# Altium footprint library Connectors.PcbLib: 164 footprints (part 8 of 11)
Each footprint in its own frame and in the unit in brackets; x right, y up, seen from the top. Pads: shape width x height; smd on the part's side, far side on the other; paste and mask are expansions set on the pad; w line width, h text height; cw(c..) or ccw(c..) is an arc to the next point about the centre after c.
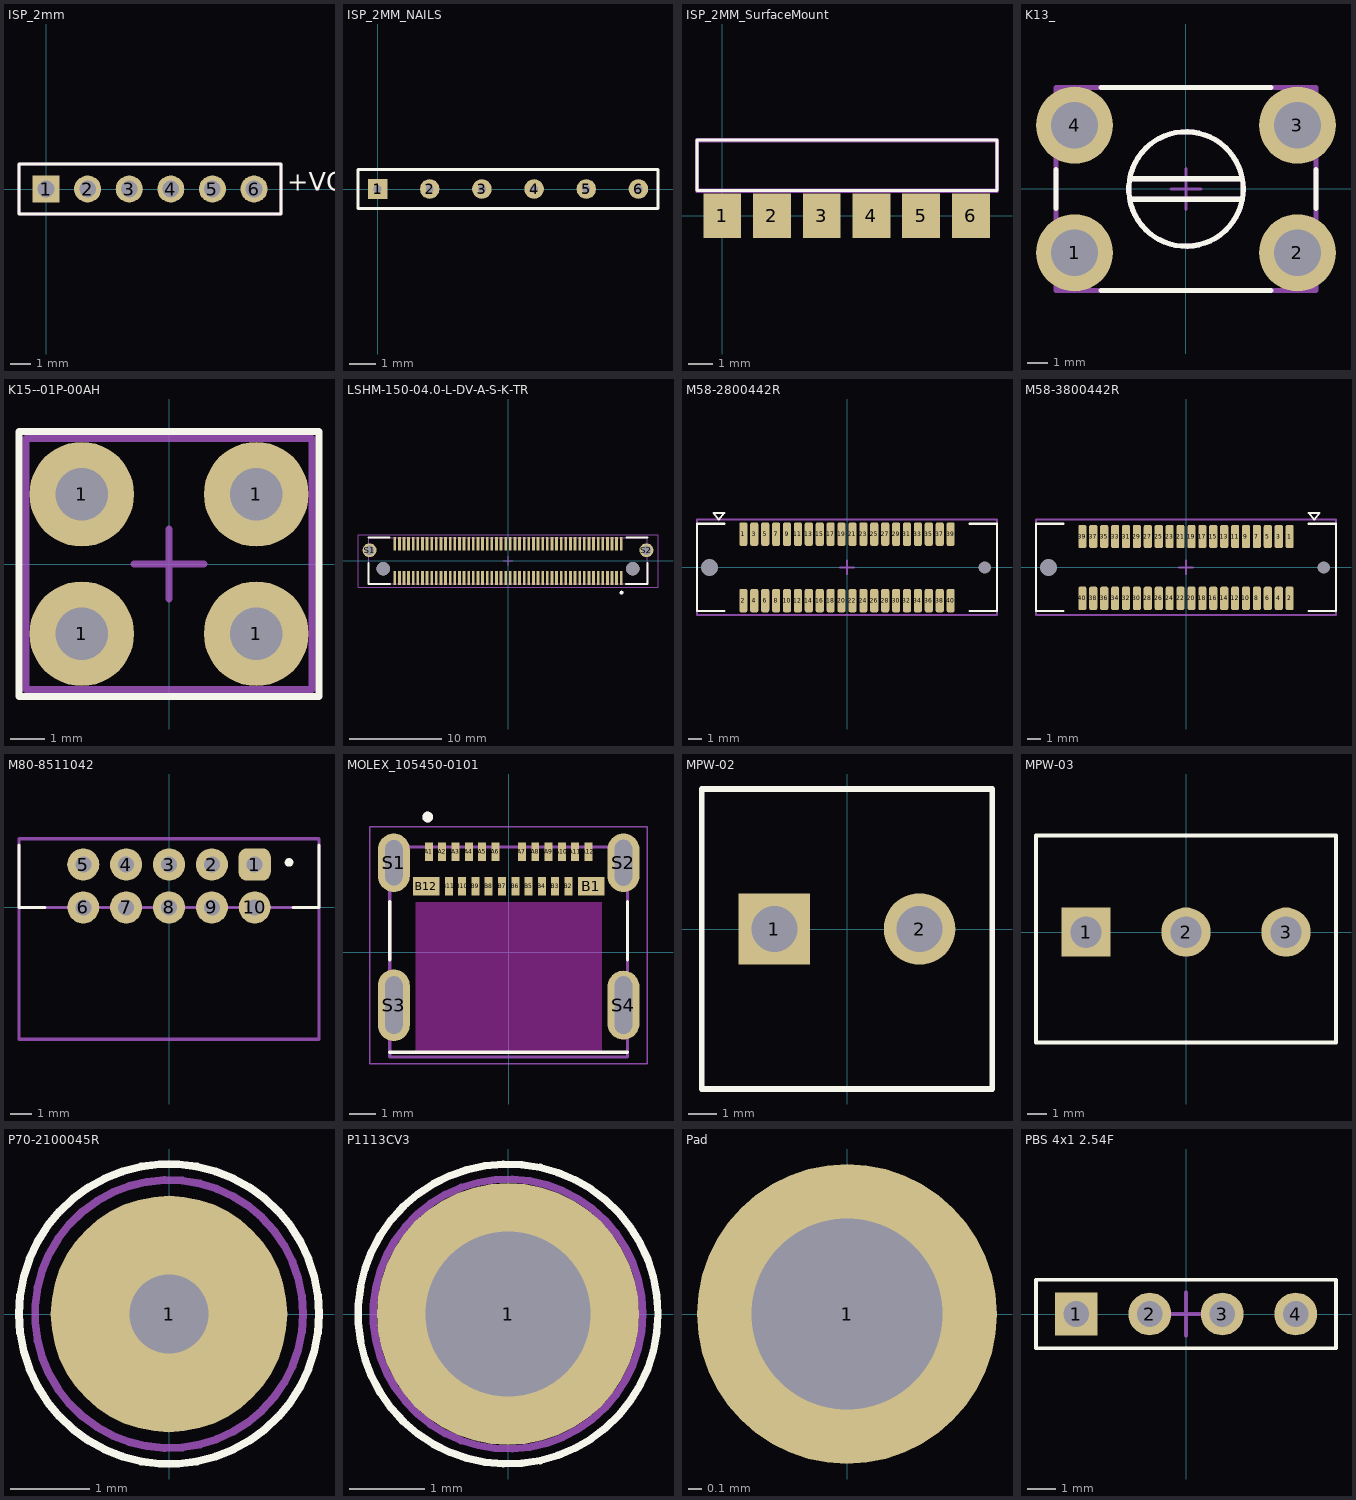
[diagram p7: the footprints below, top view; thin cyan lines are the x and y axes]

## ISP_2mm [mm]
height 4.5
pads (6):
  rect 1.3x1.3 hole 0.8: 1(0,0)
  round 1.3 hole 0.8: 2(2,0) 3(4,0) 4(6,0) 5(8,0) 6(10,0)
Top Overlay:
  lines w0.127: -1.3,-1.2 11.3,-1.2 11.3,1.2 -1.3,1.2 -1.3,-0.284 -1.3,-1.2
  text "+VCC" at 11.6,-0.4 h1.52
Mechanical 15:
  lines w0.15: -1.3,-1.2 -1.3,1.2 11.3,1.2 11.3,-1.2 -1.3,-1.2
3D body "DS1026-01-1x6.STEP": height 4.3, standoff -2.4, extent -1.3,-1.2 11.3,1.2

## ISP_2MM_NAILS [mm]
pads (6):
  rect 0.75x0.75 hole 0.3: 1(0,0)
  round 0.75 hole 0.3: 2(2,0) 3(4,0) 4(6,0) 5(8,0) 6(10,0)
Top Overlay:
  lines w0.127: -0.75,-0.75 10.75,-0.75 10.75,0.75 -0.75,0.75 -0.75,-0.266 -0.75,-0.75

## ISP_2MM_SurfaceMount [mil]
height 177.17
pads (6):
  rect 60x70 smd: 1(0,0) 2(78.74,0) 3(157.48,0) 4(236.22,0) 5(314.96,0) 6(393.7,0)
Top Overlay:
  lines w5: -40,40 435,40 435,120 -40,120 -40,40
Mechanical 13:
  lines w7: -40,40 435,40 435,120 -40,120 -40,40
3D body: height 177.17, standoff 0, extent -39.98,40.02 434.98,119.98

## K13_ [mm]
height 10
pads (4):
  round 3.8 hole 2.3: 1(-5.5,-3.15) 2(5.5,-3.15) 3(5.5,3.15) 4(-5.5,3.15)
Top Overlay:
  circle w0.254: c0,0 r2.825
  lines w0.254: -6.413,-0.965 -6.413,0.965 ; -4.178,-5.004 4.178,-5.004 ; -4.178,5.004 4.178,5.004 ; -2.756,-0.508 2.781,-0.508 ; -2.756,0.508 2.756,0.508 ; 6.413,-0.965 6.413,0.965
Mechanical 15:
  circle w0.254: c0,0 r2.825
  lines w0.15: -0.75,0 0.75,0 ; 0,-1 0,1
  lines w0.254: -2.756,-0.508 2.779,-0.508 ; -2.756,0.508 2.756,0.508 ; 3.594,5.004 6.413,5.004 ; 6.413,5.004 6.413,-5.004 -6.413,-5.004 -6.413,5.004 6.413,5.004

## K15--01P-00AH [mm]
height 7
pads (4):
  round 3 hole 1.5: 1(-2.5,-2) 1(-2.5,2) 1(2.5,-2) 1(2.5,2)
Top Overlay:
  lines w0.2: -4.3,-3.8 -4.3,3.8 4.3,3.8 4.3,-3.8 -4.3,-3.8
Mechanical 13:
  lines w0.2: -1,0 1,0 ; 0,-1 0,1 ; -4.1,-3.6 -4.1,3.6 4.1,3.6 4.1,-3.6 -4.1,-3.6
3D body "9586.10.02.105#Контакт.STEP": height 7.2, standoff -2.8, extent -4,-3.5 4,3.5

## LSHM-150-04.0-L-DV-A-S-K-TR [mm]
height 5.6
pads (104):
  rect 0.3x1.5 smd: 1(12.25,-1.85) 2(12.25,1.85) 3(11.75,-1.85) 4(11.75,1.85) 5(11.25,-1.85) 6(11.25,1.85) 7(10.75,-1.85) 8(10.75,1.85) 9(10.25,-1.85) 10(10.25,1.85) 11(9.75,-1.85) 12(9.75,1.85) 13(9.25,-1.85) 14(9.25,1.85) 15(8.75,-1.85) 16(8.75,1.85) 17(8.25,-1.85) 18(8.25,1.85) 19(7.75,-1.85) 20(7.75,1.85) 21(7.25,-1.85) 22(7.25,1.85) 23(6.75,-1.85) 24(6.75,1.85) 25(6.25,-1.85) 26(6.25,1.85) 27(5.75,-1.85) 28(5.75,1.85) 29(5.25,-1.85) 30(5.25,1.85) 31(4.75,-1.85) 32(4.75,1.85) 33(4.25,-1.85) 34(4.25,1.85) 35(3.75,-1.85) 36(3.75,1.85) 37(3.25,-1.85) 38(3.25,1.85) 39(2.75,-1.85) 40(2.75,1.85) 41(2.25,-1.85) 42(2.25,1.85) 43(1.75,-1.85) 44(1.75,1.85) 45(1.25,-1.85) 46(1.25,1.85) 47(0.75,-1.85) 48(0.75,1.85) 49(0.25,-1.85) 50(0.25,1.85) 51(-0.25,-1.85) 52(-0.25,1.85) 53(-0.75,-1.85) 54(-0.75,1.85) 55(-1.25,-1.85) 56(-1.25,1.85) 57(-1.75,-1.85) 58(-1.75,1.85) 59(-2.25,-1.85) 60(-2.25,1.85) 61(-2.75,-1.85) 62(-2.75,1.85) 63(-3.25,-1.85) 64(-3.25,1.85) 65(-3.75,-1.85) 66(-3.75,1.85) 67(-4.25,-1.85) 68(-4.25,1.85) 69(-4.75,-1.85) 70(-4.75,1.85) 71(-5.25,-1.85) 72(-5.25,1.85) 73(-5.75,-1.85) 74(-5.75,1.85) 75(-6.25,-1.85) 76(-6.25,1.85) 77(-6.75,-1.85) 78(-6.75,1.85) 79(-7.25,-1.85) 80(-7.25,1.85) 81(-7.75,-1.85) 82(-7.75,1.85) 83(-8.25,-1.85) 84(-8.25,1.85) 85(-8.75,-1.85) 86(-8.75,1.85) 87(-9.25,-1.85) 88(-9.25,1.85) 89(-9.75,-1.85) 90(-9.75,1.85) 91(-10.25,-1.85) 92(-10.25,1.85) 93(-10.75,-1.85) 94(-10.75,1.85) 95(-11.25,-1.85) 96(-11.25,1.85) 97(-11.75,-1.85) 98(-11.75,1.85) 99(-12.25,-1.85) 100(-12.25,1.85)
  round 1.5 hole 1: S1(-14.975,1.15) S2(14.975,1.15)
  round 1.45 hole 1.45 unplated: ""(-13.5,-0.85) ""(13.5,-0.85)
Top Overlay:
  circle w0.2: c12.279,-3.429 r0.1
  lines w0.2: -15.075,-0.3 -15.075,-2.49 ; -15.075,-0.2 -15.075,-2.49 ; -15.075,2.51 -12.8,2.51 ; -12.8,-2.49 -15.075,-2.49 ; -12.75,-2.49 -15.075,-2.49 ; 12.75,-2.49 15.075,-2.49 ; 12.8,2.51 15.075,2.51 ; 15.075,-0.3 15.075,-2.49 ; 15.075,-0.2 15.075,-2.49
Top Paste:
  circle w1: c14.975,1.15 r0.5
  circle w1: c-14.975,1.15 r0.5
Mechanical 13:
  circle w0.2: c12.279,-3.429 r0.1
  lines w0.1: -15.075,-2.49 15.075,-2.49 15.075,2.49 -15.075,2.49 -15.075,-2.49
Mechanical 15:
  lines w0.05: -16.225,-2.85 16.225,-2.85 16.225,2.85 -16.225,2.85 -16.225,-2.85
  lines w0.1: -0.5,0 0.5,0 ; 0,-0.5 0,0.5
3D body "LSHM-150-04.0-L-DV-A-S-K-TR.stp": height 5.58, standoff -1.67, extent -15.4,-2.49 15.401,2.54

## M58-2800442R [mm]
height 3.7
pads (42):
  rrect50% 0.6x1.72 smd paste-2539.97: 1(-7.6,2.435) 2(-7.6,-2.435) 3(-6.8,2.435) 4(-6.8,-2.435) 5(-6,2.435) 6(-6,-2.435) 7(-5.2,2.435) 8(-5.2,-2.435) 9(-4.4,2.435) 10(-4.4,-2.435) 11(-3.6,2.435) 12(-3.6,-2.435) 13(-2.8,2.435) 14(-2.8,-2.435) 15(-2,2.435) 16(-2,-2.435) 17(-1.2,2.435) 18(-1.2,-2.435) 19(-0.4,2.435) 20(-0.4,-2.435) 21(0.4,2.435) 22(0.4,-2.435) 23(1.2,2.435) 24(1.2,-2.435) 25(2,2.435) 26(2,-2.435) 27(2.8,2.435) 28(2.8,-2.435) 29(3.6,2.435) 30(3.6,-2.435) 31(4.4,2.435) 32(4.4,-2.435) 33(5.2,2.435) 34(5.2,-2.435) 35(6,2.435) 36(6,-2.435) 37(6.8,2.435) 38(6.8,-2.435) 39(7.6,2.435) 40(7.6,-2.435)
  rect 0x0 hole 1.25 unplated: NC(-10.1,0)
  rect 0x0 hole 0.9 unplated: NC(10.1,0)
Top Overlay:
  lines w0.15: -9,-3.2 -11,-3.2 -11,3.2 -9,3.2 ; 9,-3.2 11,-3.2 11,3.2 9,3.2 ; -9.8,4 -9,4 -9.4,3.5 -9.8,4
Top Paste:
  drawing of 40 lines, arcs and shapes, not listed
Mechanical 13:
  lines w0.15: -0.5,0 0.5,0 ; 0,-0.5 0,0.5 ; -11,-3.5 -11,3.5 11,3.5 11,-3.5 -11,-3.5
3D body "m58-2800442_asm.stp": height 3.67, standoff -0.72, extent -10.875,-3 10.875,3

## M58-3800442R [mm]
pads (42):
  rrect50% 0.6x1.72 smd: 1(7.6,2.265) 2(7.6,-2.265) 3(6.8,2.265) 4(6.8,-2.265) 5(6,2.265) 6(6,-2.265) 7(5.2,2.265) 8(5.2,-2.265) 9(4.4,2.265) 10(4.4,-2.265) 11(3.6,2.265) 12(3.6,-2.265) 13(2.8,2.265) 14(2.8,-2.265) 15(2,2.265) 16(2,-2.265) 17(1.2,2.265) 18(1.2,-2.265) 19(0.4,2.265) 20(0.4,-2.265) 21(-0.4,2.265) 22(-0.4,-2.265) 23(-1.2,2.265) 24(-1.2,-2.265) 25(-2,2.265) 26(-2,-2.265) 27(-2.8,2.265) 28(-2.8,-2.265) 29(-3.6,2.265) 30(-3.6,-2.265) 31(-4.4,2.265) 32(-4.4,-2.265) 33(-5.2,2.265) 34(-5.2,-2.265) 35(-6,2.265) 36(-6,-2.265) 37(-6.8,2.265) 38(-6.8,-2.265) 39(-7.6,2.265) 40(-7.6,-2.265)
  rect 0x0 hole 1.25 unplated: NC(-10.1,0)
  rect 0x0 hole 0.9 unplated: NC(10.1,0)
Top Overlay:
  lines w0.15: -9,-3.2 -11,-3.2 -11,3.2 -9,3.2 ; 9,-3.2 11,-3.2 11,3.2 9,3.2 ; 9,4 9.4,3.5 9.8,4 9,4
Mechanical 13:
  lines w0.15: -0.5,0 0.5,0 ; 0,-0.5 0,0.5 ; -11,-3.5 11,-3.5 11,3.5 -11,3.5 -11,-3.5
3D body "m58-3800442_asm.stp": height 4.78, standoff -0.64, extent -10.875,-2.99 10.875,2.99

## M80-8511042 [mm]
pads (10):
  rrect50% 1.5x1.5 hole 0.75: 1(4,2)
  round 1.5 hole 0.75: 2(2,2) 3(0,2) 4(-2,2) 5(-4,2) 6(-4,0) 7(-2,0) 8(0,0) 9(2,0) 10(4,0)
Top Overlay:
  circle w0.2: c5.6,2.1 r0.1
  lines w0.15: -7,2.9 -7,0 -5.8,0 ; 5.8,0 7,0 7,2.9
Mechanical 13:
  lines w0.15: -7,0 -7,3.2 7,3.2 7,0 ; -7,0 7,0 ; -7,0 -7,-6.15 7,-6.15 7,0

## MOLEX_105450-0101 [mm]
height 3.24
pads (28):
  rect 0.3x0.7 smd: A1(-3,3.77) A2(-2.5,3.77) A3(-2,3.77) A4(-1.5,3.77) A5(-1,3.77) A6(-0.5,3.77) A7(0.5,3.77) A8(1,3.77) A9(1.5,3.77) A10(2,3.77) A11(2.5,3.77) A12(3,3.77) B2(2.25,2.47) B3(1.75,2.47) B4(1.25,2.47) B5(0.75,2.47) B6(0.25,2.47) B7(-0.25,2.47) B8(-0.75,2.47) B9(-1.25,2.47) B10(-1.75,2.47) B11(-2.25,2.47)
  rect 1x0.7 smd: B1(3.1,2.47) B12(-3.1,2.47)
  oval 1.2x2.2 hole 0.65 slot 1.7 at 90 deg: S1(-4.32,3.36)
  oval 1.2x2.2 hole 0.65 slot 1.725 at 90 deg: S2(4.32,3.36)
  oval 1.2x2.7 hole 0.65 slot 2.175 at 90 deg: S3(-4.32,-2)
  oval 1.2x2.6 hole 0.65 slot 2.175 at 90 deg: S4(4.32,-2)
Top Overlay:
  circle w0.2: c-3.048,5.08 r0.1
  lines w0.127: -4.47,-3.77 4.47,-3.77 ; -4.47,-0.3 -4.47,1.9 ; 4.47,-0.3 4.47,1.9
Keep-Out Layer:
  region: 3.5,-3.77 -3.5,-3.77 -3.5,1.88 3.5,1.88
Mechanical 13:
  circle w0.2: c-3.048,5.08 r0.1
  lines w0.127: -4.47,-3.95 4.47,-3.95 4.47,3.95 -4.47,3.95 -4.47,-3.95
Mechanical 15:
  lines w0.05: -5.22,-4.2 5.22,-4.2 5.22,4.71 -5.22,4.71 -5.22,-4.2
3D body "step_temp.STEP": height 3.2, standoff -0.9, extent -4.47,-3.905 4.47,3.995

## MPW-02 [mm]
height 12.9
pads (2):
  rect 2.5x2.5 hole 1.6: 1(-2.54,0)
  round 2.5 hole 1.6: 2(2.54,0)
Top Overlay:
  lines w0.2: -5.08,-5.6 -5.08,4.9 5.08,4.9 5.08,-5.6 -5.08,-5.6
3D body "User Library-MPW-2.step": height 14.17, standoff -3.23, extent -5.08,-5.555 5.08,4.9

## MPW-03 [mm]
height 12.9
pads (3):
  rect 2.5x2.5 hole 1.6: 1(-5.08,0)
  round 2.5 hole 1.6: 2(0,0) 3(5.08,0)
Top Overlay:
  lines w0.2: -7.62,-5.6 -7.62,4.9 7.62,4.9 7.62,-5.6 -7.62,-5.6
3D body "User Library-MPW-3.step": height 13.8, standoff -3.6, extent -7.5,-5.207 7.5,4.7

## P70-2100045R [mm]
pads (1):
  round 3 hole 1: 1(0,0)
Top Overlay:
  circle w0.1: c0,0 r1.903
Mechanical 13:
  circle w0.1: c0,0 r1.7
  lines w0.1: -0.5,0 0.5,0 ; 0,-0.5 0,0.5
3D body "p70-2100045.stp": height 5.5, standoff -2, extent -1,-0.993 1,0.993

## P1113CV3 [mm]
pads (1):
  round 3.5 hole 2.2: 1(0,0)
Top Overlay:
  circle w0.1: c0,0 r2.003
Mechanical 13:
  circle w0.1: c0,0 r1.8
  lines w0.1: -0.5,0 0.5,0 ; 0,-0.5 0,0.5
3D body "p1113cv3.stp": height 7.2, standoff -20.01, extent -1.275,-1.275 1.275,1.275

## Pad [mm]
pads (1):
  round 2.2 hole 1.4: 1(0,0)

## PBS 4x1 2.54F [mm]
height 8.5
pads (4):
  rect 1.5x1.5 hole 0.9: 1(-3.84,0)
  round 1.5 hole 0.9: 2(-1.27,0) 3(1.27,0) 4(3.84,0)
Top Overlay:
  lines w0.127: -5.25,-1.2 -5.25,1.2 5.25,1.2 5.25,-1.2 -5.25,-1.2
Mechanical 15:
  lines w0.15: -0.75,0 0.75,0 ; 0,-0.75 0,0.75
3D body "User Library-PBS_(DS1023)_1line_connectors_h=5_0_8_5mm_step_2_54mm-1.step": height 8.5, standoff -3, extent -5.33,-1.25 5.33,1.25